# Altium footprint library PCB_ConnectorHDR.PcbLib: 119 footprints (part 2 of 8)
Each footprint in its own frame and in the unit in brackets; x right, y up, seen from the top. Pads: shape width x height; smd on the part's side, far side on the other; paste and mask are expansions set on the pad; w line width, h text height; cw(c..) or ccw(c..) is an arc to the next point about the centre after c.
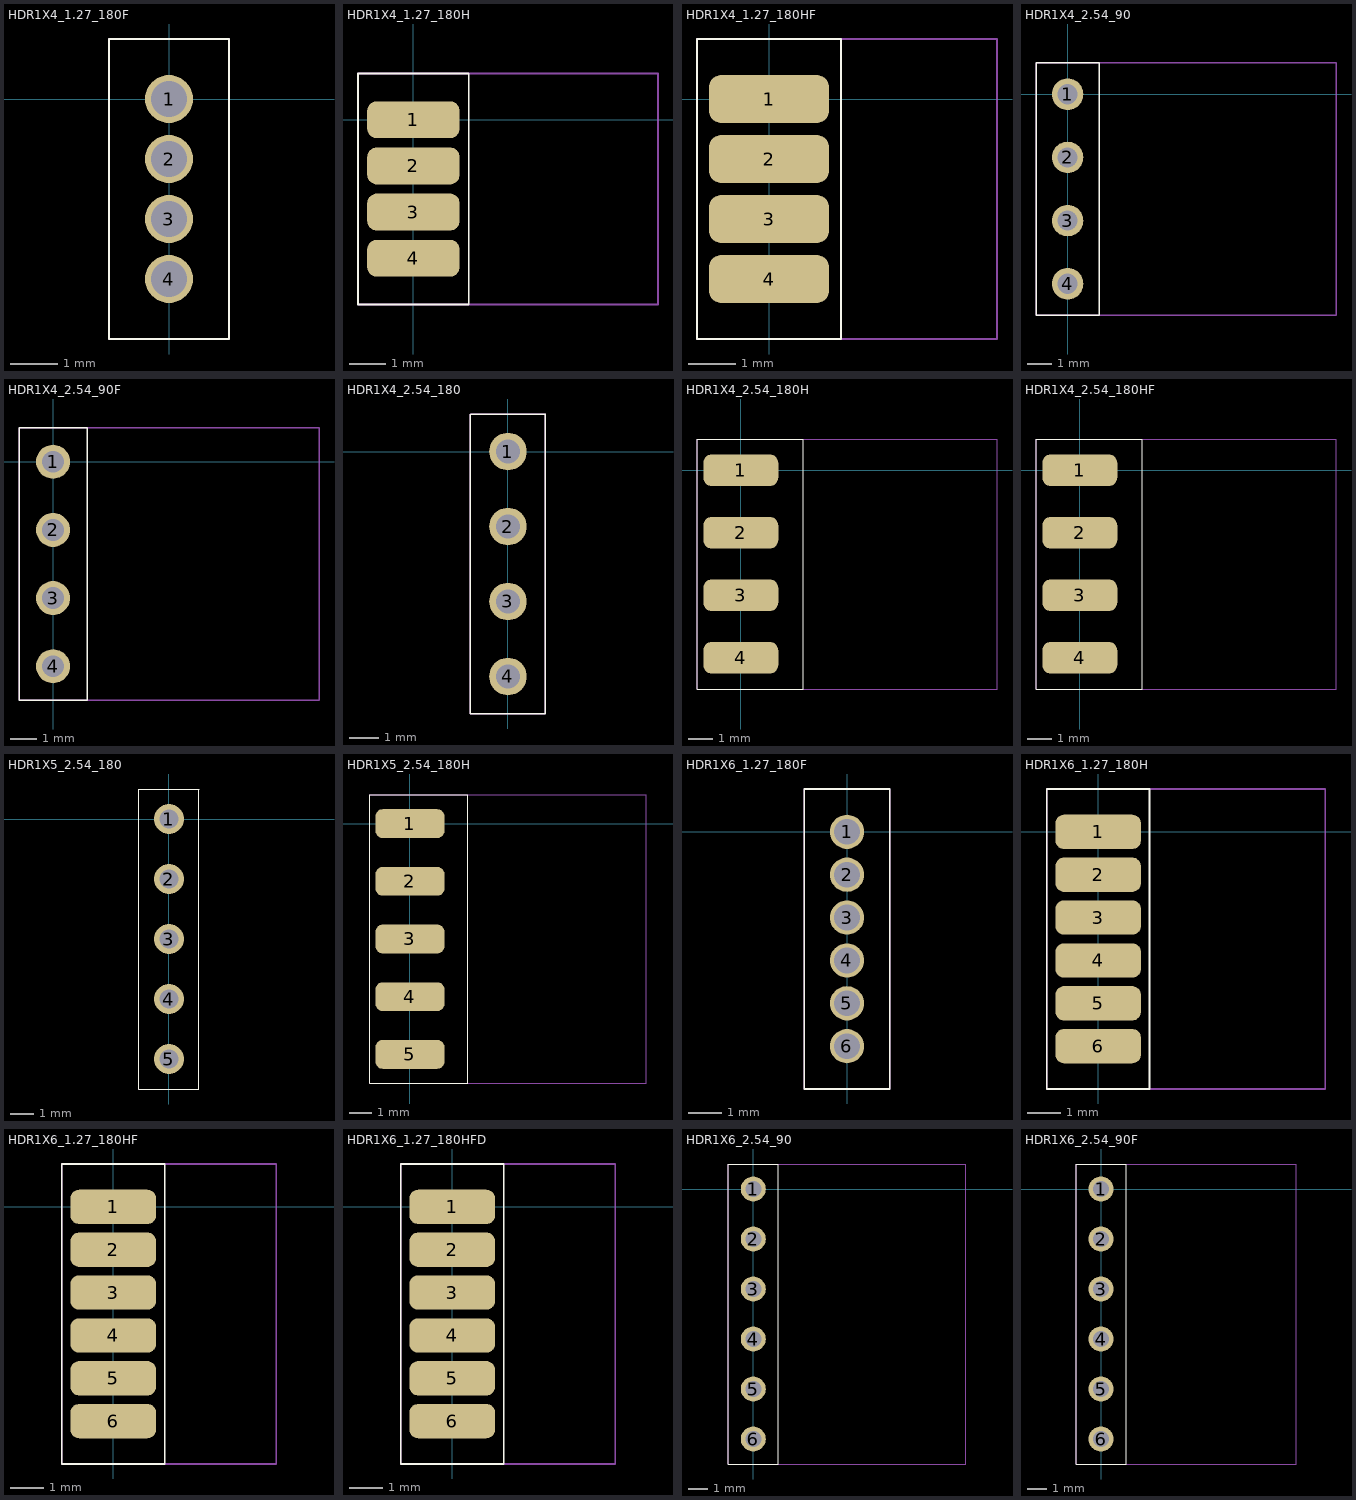
[diagram p1: the footprints below, top view; thin cyan lines are the x and y axes]

## HDR1X4_1.27_180F [mil]
height 169.29
pads (4):
  round 40 hole 30: 1(0,0) 2(0,-50) 3(0,-100) 4(0,-150)
Top Overlay:
  lines w2: -50,-200 50,-200 50,50 -50,50 -50,-200
Mechanical 13:
  lines w2: -50,-200 50,-200 50,50 -50,50 -50,-200
3D body "female_header_a-bl127-eg-g04d.stp": height 133.86, standoff -94.49, extent -35.87,-182.88 35,32.88

## HDR1X4_1.27_180H [mil]
height 169.29
pads (4):
  rrect50% 100x40 smd: 1(0,0) 2(0,-50) 3(0,-100) 4(0,-150)
Top Overlay:
  lines w2: -60,-200 -60,50 60,50 60,-200 -60,-200
Mechanical 13:
  lines w2: -60,-200 -60,50 265,50 265,-200 -60,-200
3D body "pin_header_a-sl127-eg-g04d.stp": height 59.21, standoff -39.21, extent -47.36,-174.99 265.24,25.01

## HDR1X4_1.27_180HF [mil]
height 169.29
pads (4):
  rrect50% 100x40 smd: 1(0,0) 2(0,-50) 3(0,-100) 4(0,-150)
Top Overlay:
  lines w2: -60,-200 60,-200 60,50 -60,50 -60,-200
Mechanical 13:
  lines w2: -60,-200 -60,50 190,50 190,-200 -60,-200
3D body "female_header_a-bl127-eg-g04d.stp": height 45.43, standoff -25.43, extent -38.35,-182.88 190,32.88

## HDR1X4_2.54_90 [mil]
height 169.29
pads (4):
  round 50 hole 32: 1(0,0) 2(0,-100) 3(0,-200) 4(0,-300)
Top Overlay:
  lines w2: -50,-350 -50,50 50,50 50,-350 -50,-350
Mechanical 13:
  lines w2: -50,-350 425,-350 425,50 -50,50 -50,-350
3D body "pin_header_aw140-ea-g04g.stp": height 99.21, standoff -93.7, extent -14.96,-346.06 423.62,46.07

## HDR1X4_2.54_90F [mil]
height 169.29
pads (4):
  round 50 hole 32: 1(0,0) 2(0,-100) 3(0,-200) 4(0,-300)
Top Overlay:
  lines w2: -50,-350 50,-350 50,50 -50,50 -50,-350
Mechanical 13:
  lines w2: -50,-350 -50,50 390,50 390,-350 -50,-350
3D body "female_header_a-bl254-ea-g04d.stp": height 99.21, standoff -125.2, extent -10,-354.92 386.06,54.92

## HDR1X4_2.54_180 [mil]
height 169.29
pads (4):
  round 50 hole 32: 1(0,0) 2(0,-100) 3(0,-200) 4(0,-300)
Top Overlay:
  lines w2: -50,-350 -50,50 50,50 50,-350 -50,-350
Mechanical 13:
  lines w2: -50,-350 -50,50 50,50 50,-350 -50,-350
3D body "pin_header_aw140-eg-g04d.stp": height 322.83, standoff -118.11, extent -49.18,-350 49.18,50

## HDR1X4_2.54_180H [mil]
height 169.29
pads (4):
  rrect50% 120x50 smd: 1(0,0) 2(0,-100) 3(0,-200) 4(0,-300)
Top Overlay:
  lines w2: -70,-350 -70,50 100,50 100,-350 -70,-350
Mechanical 13:
  lines w2: -70,-350 410,-350 410,50 -70,50 -70,-350
3D body "pin_header_aw140-eg-g04d.stp": height 61.32, standoff -37.05, extent -35,-350 405.94,50

## HDR1X4_2.54_180HF [mil]
height 169.29
pads (4):
  rrect50% 120x50 smd: 1(0,0) 2(0,-100) 3(0,-200) 4(0,-300)
Top Overlay:
  lines w2: -70,-350 -70,50 100,50 100,-350 -70,-350
Mechanical 13:
  lines w2: -70,-350 410,-350 410,50 -70,50 -70,-350

## HDR1X5_2.54_180 [mil]
height 169.29
pads (5):
  round 50 hole 32: 1(0,0) 2(0,-100) 3(0,-200) 4(0,-300) 5(0,-400)
Top Overlay:
  lines w2: -50,-450 50,-450 50,50 -50,50 -50,-450
Mechanical 13:
  lines w2: -50,-450 -50,50 50,50 50,-450 -50,-450
3D body "pin_header_aw140-eg-g05d.stp": height 322.83, standoff -118.11, extent -49.18,-450 49.18,50

## HDR1X5_2.54_180H [mil]
height 169.29
pads (5):
  rrect50% 120x50 smd: 1(0,0) 2(0,-100) 3(0,-200) 4(0,-300) 5(0,-400)
Top Overlay:
  lines w2: -70,-450 -70,50 100,50 100,-450 -70,-450
Mechanical 13:
  lines w2: -70,-450 410,-450 410,50 -70,50 -70,-450
3D body "pin_header_aw140-eg-g05d.stp": height 61.32, standoff -37.05, extent -35,-450 405.95,50

## HDR1X6_1.27_180F [mil]
height 169.29
pads (6):
  round 40 hole 30: 1(0,0) 2(0,-50) 3(0,-100) 4(0,-150) 5(0,-200) 6(0,-250)
Top Overlay:
  lines w2: -50,-300 50,-300 50,50 -50,50 -50,-300
Mechanical 13:
  lines w2: -50,-300 50,-300 50,50 -50,50 -50,-300

## HDR1X6_1.27_180H [mil]
height 169.29
pads (6):
  rrect50% 100x40 smd: 1(0,0) 2(0,-50) 3(0,-100) 4(0,-150) 5(0,-200) 6(0,-250)
Top Overlay:
  lines w2: -60,-300 -60,50 60,50 60,-300 -60,-300
Mechanical 13:
  lines w2: -60,-300 265,-300 265,50 -60,50 -60,-300
3D body "pin_header_a-sl127-eg-g06d.stp": height 49.21, standoff -49.21, extent -47.36,-274.99 265.24,25.01

## HDR1X6_1.27_180HF [mil]
height 169.29
pads (6):
  rrect50% 100x40 smd: 1(0,0) 2(0,-50) 3(0,-100) 4(0,-150) 5(0,-200) 6(0,-250)
Top Overlay:
  lines w2: -60,-300 60,-300 60,50 -60,50 -60,-300
Mechanical 13:
  lines w2: -60,-300 -60,50 190,50 190,-300 -60,-300
3D body "female_header_a-bl127-eg-g06d.stp": height 35.43, standoff -35.43, extent -38.35,-282.88 190,32.88

## HDR1X6_1.27_180HFD [mil]
height 169.29
pads (6):
  rrect50% 100x40 smd: 1(0,0) 2(0,-50) 3(0,-100) 4(0,-150) 5(0,-200) 6(0,-250)
Top Overlay:
  lines w2: -60,-300 60,-300 60,50 -60,50 -60,-300
Mechanical 13:
  lines w2: -60,-300 -60,50 190,50 190,-300 -60,-300
3D body "female_header_a-bl127-eg-g06d.stp": height 71.43, standoff 0.57, extent -38.35,-282.88 190,32.88

## HDR1X6_2.54_90 [mil]
height 169.29
pads (6):
  round 50 hole 32: 1(0,0) 2(0,-100) 3(0,-200) 4(0,-300) 5(0,-400) 6(0,-500)
Top Overlay:
  lines w2: -50,-550 50,-550 50,50 -50,50 -50,-550
Mechanical 13:
  lines w2: -50,-550 425,-550 425,50 -50,50 -50,-550
3D body "pin_header_aw140-ea-g06g.stp": height 99.21, standoff -93.7, extent -14.96,-546.06 423.62,46.07

## HDR1X6_2.54_90F [mil]
height 169.29
pads (6):
  round 50 hole 32: 1(0,0) 2(0,-100) 3(0,-200) 4(0,-300) 5(0,-400) 6(0,-500)
Top Overlay:
  lines w2: -50,-550 50,-550 50,50 -50,50 -50,-550
Mechanical 13:
  lines w2: -50,-550 -50,50 390,50 390,-550 -50,-550
3D body "female_header_a-bl254-ea-g06d.stp": height 99.21, standoff -125.2, extent -10,-554.92 386.06,54.92